# Altium footprint library Package_DFN_QFN.PcbLib: 557 footprints (part 22 of 35)
Each footprint in its own frame and in the unit in brackets; x right, y up, seen from the top. Pads: shape width x height; smd on the part's side, far side on the other; paste and mask are expansions set on the pad; w line width, h text height; cw(c..) or ccw(c..) is an arc to the next point about the centre after c.
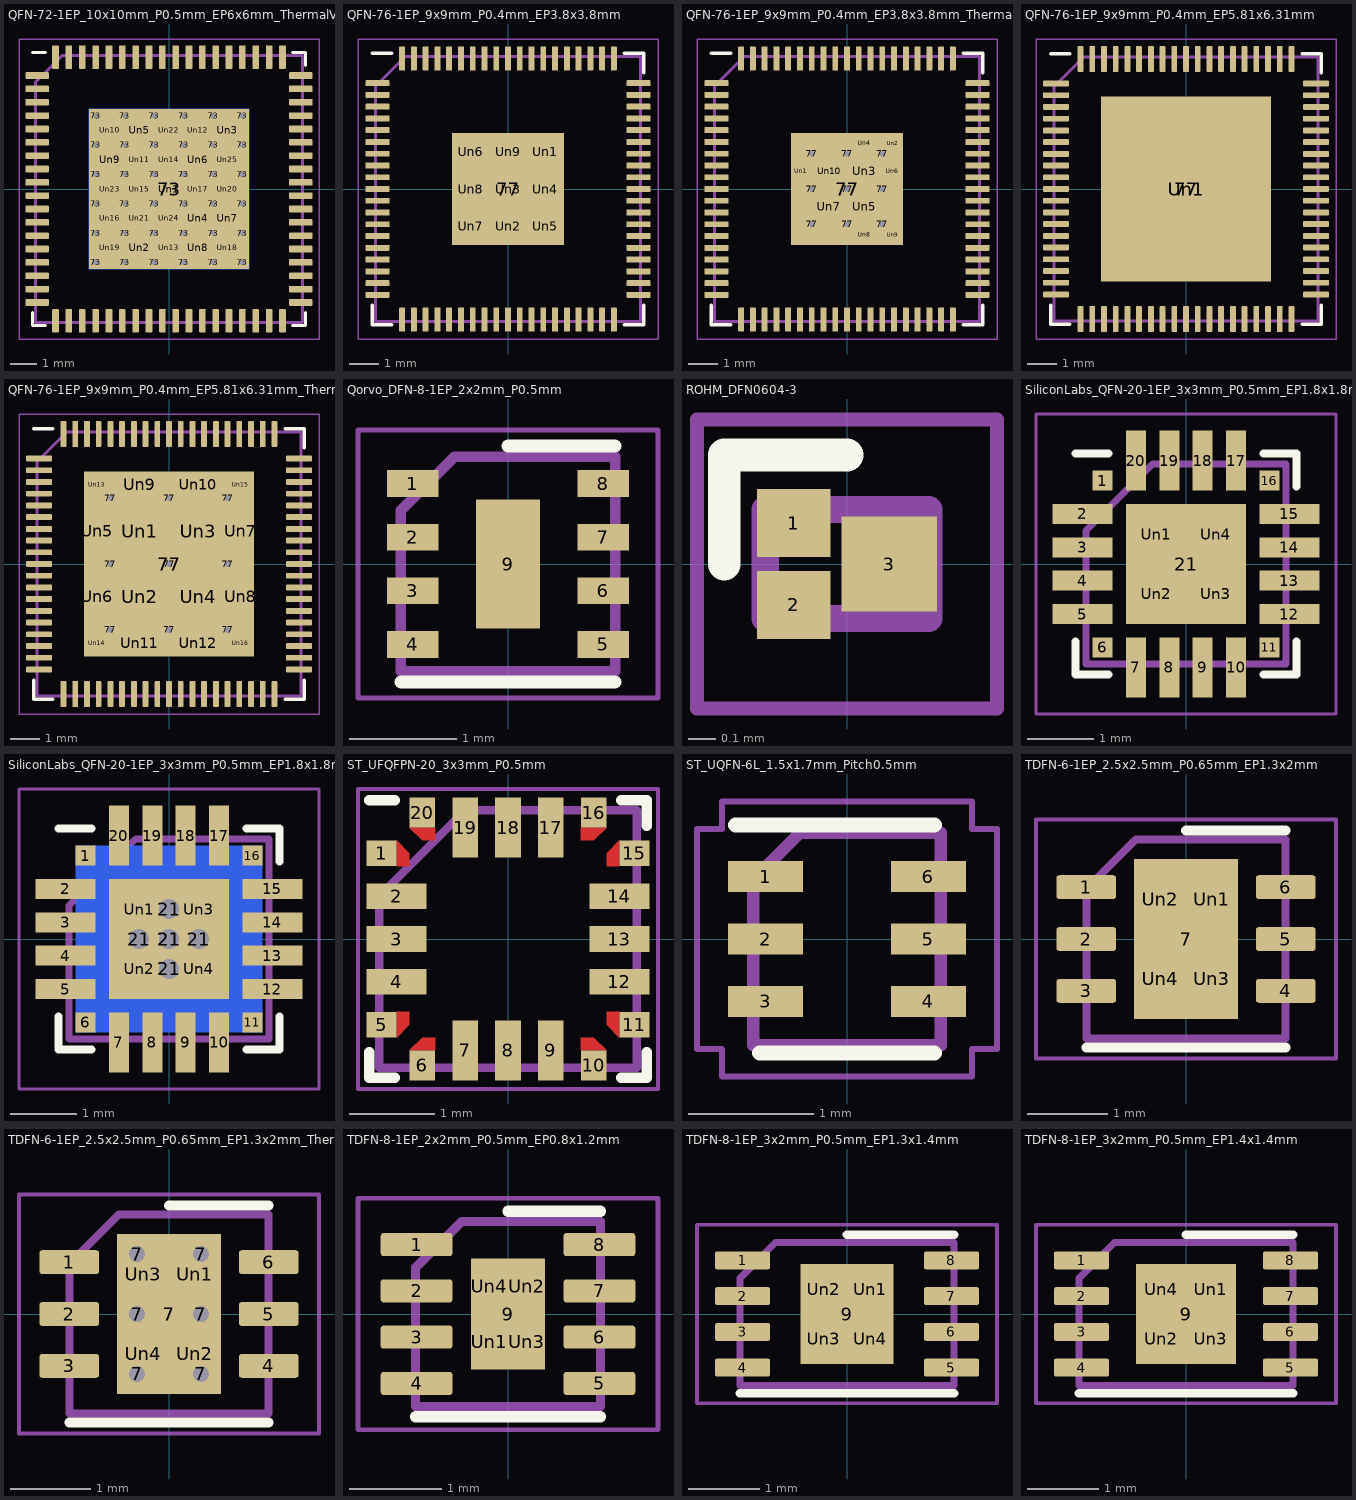
[diagram p21: the footprints below, top view; thin cyan lines are the x and y axes]

## QFN-72-1EP_10x10mm_P0.5mm_EP6x6mm_ThermalVias [mm]
pads (135):
  rrect25% 0.875x0.25 smd: 1(-4.938,4.25) 2(-4.938,3.75) 3(-4.938,3.25) 4(-4.938,2.75) 5(-4.938,2.25) 6(-4.938,1.75) 7(-4.938,1.25) 8(-4.938,0.75) 9(-4.938,0.25) 10(-4.938,-0.25) 11(-4.938,-0.75) 12(-4.938,-1.25) 13(-4.938,-1.75) 14(-4.938,-2.25) 15(-4.938,-2.75) 16(-4.938,-3.25) 17(-4.938,-3.75) 18(-4.938,-4.25) 37(4.938,-4.25) 38(4.938,-3.75) 39(4.938,-3.25) 40(4.938,-2.75) 41(4.938,-2.25) 42(4.938,-1.75) 43(4.938,-1.25) 44(4.938,-0.75) 45(4.938,-0.25) 46(4.938,0.25) 47(4.938,0.75) 48(4.938,1.25) 49(4.938,1.75) 50(4.938,2.25) 51(4.938,2.75) 52(4.938,3.25) 53(4.938,3.75) 54(4.938,4.25)
  rrect25% 0.25x0.875 smd: 19(-4.25,-4.938) 20(-3.75,-4.938) 21(-3.25,-4.938) 22(-2.75,-4.938) 23(-2.25,-4.938) 24(-1.75,-4.938) 25(-1.25,-4.938) 26(-0.75,-4.938) 27(-0.25,-4.938) 28(0.25,-4.938) 29(0.75,-4.938) 30(1.25,-4.938) 31(1.75,-4.938) 32(2.25,-4.938) 33(2.75,-4.938) 34(3.25,-4.938) 35(3.75,-4.938) 36(4.25,-4.938) 55(4.25,4.938) 56(3.75,4.938) 57(3.25,4.938) 58(2.75,4.938) 59(2.25,4.938) 60(1.75,4.938) 61(1.25,4.938) 62(0.75,4.938) 63(0.25,4.938) 64(-0.25,4.938) 65(-0.75,4.938) 66(-1.25,4.938) 67(-1.75,4.938) 68(-2.25,4.938) 69(-2.75,4.938) 70(-3.25,4.938) 71(-3.75,4.938) 72(-4.25,4.938)
  round 0.5 hole 0.2: 73(-2.75,-2.75) 73(-2.75,-1.65) 73(-2.75,-0.55) 73(-2.75,0.55) 73(-2.75,1.65) 73(-2.75,2.75) 73(-1.65,-2.75) 73(-1.65,-1.65) 73(-1.65,-0.55) 73(-1.65,0.55) 73(-1.65,1.65) 73(-1.65,2.75) 73(-0.55,-2.75) 73(-0.55,-1.65) 73(-0.55,-0.55) 73(-0.55,0.55) 73(-0.55,1.65) 73(-0.55,2.75) 73(0.55,-2.75) 73(0.55,-1.65) 73(0.55,-0.55) 73(0.55,0.55) 73(0.55,1.65) 73(0.55,2.75) 73(1.65,-2.75) 73(1.65,-1.65) 73(1.65,-0.55) 73(1.65,0.55) 73(1.65,1.65) 73(1.65,2.75) 73(2.75,-2.75) 73(2.75,-1.65) 73(2.75,-0.55) 73(2.75,0.55) 73(2.75,1.65) 73(2.75,2.75)
  rect 6x6 smd far side: 73(0,0)
  rect 6x6 smd: 73(0,0)
  rrect25% 0.93x0.93 on Top Paste: Un1(0,0) Un2(-1.1,-2.2) Un3(2.2,2.2) Un4(1.1,-1.1) Un5(-1.1,2.2) Un6(1.1,1.1) Un7(2.2,-1.1) Un8(1.1,-2.2) Un9(-2.2,1.1) Un10(-2.2,2.2) Un11(-1.1,1.1) Un12(1.1,2.2) Un13(0,-2.2) Un14(0,1.1) Un15(-1.1,0) Un16(-2.2,-1.1) Un17(1.1,0) Un18(2.2,-2.2) Un19(-2.2,-2.2) Un20(2.2,0) Un21(-1.1,-1.1) Un22(0,2.2) Un23(-2.2,0) Un24(0,-1.1) Un25(2.2,1.1)
F.SilkS:
  lines w0.12: -5.11,-4.635 -5.11,-5.11 -4.635,-5.11 ; -5.11,5.11 -4.635,5.11 ; 4.635,-5.11 5.11,-5.11 5.11,-4.635 ; 4.635,5.11 5.11,5.11 5.11,4.635
F.CrtYd:
  lines w0.05: -5.62,-5.62 -5.62,5.62 5.62,5.62 5.62,-5.62 -5.62,-5.62
F.Fab:
  lines w0.1: -5,-5 5,-5 5,5 -4,5 -5,4 -5,-5
  text "'.Designator'" at -4.047,-0.84 h1

## QFN-76-1EP_9x9mm_P0.4mm_EP3.8x3.8mm [mm]
pads (86):
  rrect25% 0.825x0.2 smd: 1(-4.437,3.6) 2(-4.437,3.2) 3(-4.437,2.8) 4(-4.437,2.4) 5(-4.437,2) 6(-4.437,1.6) 7(-4.437,1.2) 8(-4.437,0.8) 9(-4.437,0.4) 10(-4.437,0) 11(-4.437,-0.4) 12(-4.437,-0.8) 13(-4.437,-1.2) 14(-4.437,-1.6) 15(-4.437,-2) 16(-4.437,-2.4) 17(-4.437,-2.8) 18(-4.437,-3.2) 19(-4.437,-3.6) 39(4.437,-3.6) 40(4.437,-3.2) 41(4.437,-2.8) 42(4.437,-2.4) 43(4.437,-2) 44(4.437,-1.6) 45(4.437,-1.2) 46(4.437,-0.8) 47(4.437,-0.4) 48(4.437,0) 49(4.437,0.4) 50(4.437,0.8) 51(4.437,1.2) 52(4.437,1.6) 53(4.437,2) 54(4.437,2.4) 55(4.437,2.8) 56(4.437,3.2) 57(4.437,3.6)
  rrect25% 0.2x0.825 smd: 20(-3.6,-4.437) 21(-3.2,-4.437) 22(-2.8,-4.437) 23(-2.4,-4.437) 24(-2,-4.437) 25(-1.6,-4.437) 26(-1.2,-4.437) 27(-0.8,-4.437) 28(-0.4,-4.437) 29(0,-4.437) 30(0.4,-4.437) 31(0.8,-4.437) 32(1.2,-4.437) 33(1.6,-4.437) 34(2,-4.437) 35(2.4,-4.437) 36(2.8,-4.437) 37(3.2,-4.437) 38(3.6,-4.437) 58(3.6,4.437) 59(3.2,4.437) 60(2.8,4.437) 61(2.4,4.437) 62(2,4.437) 63(1.6,4.437) 64(1.2,4.437) 65(0.8,4.437) 66(0.4,4.437) 67(0,4.437) 68(-0.4,4.437) 69(-0.8,4.437) 70(-1.2,4.437) 71(-1.6,4.437) 72(-2,4.437) 73(-2.4,4.437) 74(-2.8,4.437) 75(-3.2,4.437) 76(-3.6,4.437)
  rect 3.8x3.8 smd: 77(0,0)
  rrect25% 1.02x1.02 on Top Paste: Un1(1.27,1.27) Un2(0,-1.27) Un3(0,0) Un4(1.27,0) Un5(1.27,-1.27) Un6(-1.27,1.27) Un7(-1.27,-1.27) Un8(-1.27,0) Un9(0,1.27)
F.SilkS:
  lines w0.12: -4.61,-3.96 -4.61,-4.61 -3.96,-4.61 ; -4.61,4.61 -3.96,4.61 ; 3.96,-4.61 4.61,-4.61 4.61,-3.96 ; 3.96,4.61 4.61,4.61 4.61,3.96
F.CrtYd:
  lines w0.05: -5.1,-5.1 5.1,-5.1 5.1,5.1 -5.1,5.1 -5.1,-5.1
F.Fab:
  lines w0.1: -4.5,-4.5 -4.5,3.5 -3.5,4.5 4.5,4.5 4.5,-4.5 -4.5,-4.5
  text "'.Designator'" at -4.047,-0.84 h1

## QFN-76-1EP_9x9mm_P0.4mm_EP3.8x3.8mm_ThermalVias [mm]
pads (103):
  rrect25% 0.825x0.2 smd: 1(-4.437,3.6) 2(-4.437,3.2) 3(-4.437,2.8) 4(-4.437,2.4) 5(-4.437,2) 6(-4.437,1.6) 7(-4.437,1.2) 8(-4.437,0.8) 9(-4.437,0.4) 10(-4.437,0) 11(-4.437,-0.4) 12(-4.437,-0.8) 13(-4.437,-1.2) 14(-4.437,-1.6) 15(-4.437,-2) 16(-4.437,-2.4) 17(-4.437,-2.8) 18(-4.437,-3.2) 19(-4.437,-3.6) 39(4.437,-3.6) 40(4.437,-3.2) 41(4.437,-2.8) 42(4.437,-2.4) 43(4.437,-2) 44(4.437,-1.6) 45(4.437,-1.2) 46(4.437,-0.8) 47(4.437,-0.4) 48(4.437,0) 49(4.437,0.4) 50(4.437,0.8) 51(4.437,1.2) 52(4.437,1.6) 53(4.437,2) 54(4.437,2.4) 55(4.437,2.8) 56(4.437,3.2) 57(4.437,3.6)
  rrect25% 0.2x0.825 smd: 20(-3.6,-4.437) 21(-3.2,-4.437) 22(-2.8,-4.437) 23(-2.4,-4.437) 24(-2,-4.437) 25(-1.6,-4.437) 26(-1.2,-4.437) 27(-0.8,-4.437) 28(-0.4,-4.437) 29(0,-4.437) 30(0.4,-4.437) 31(0.8,-4.437) 32(1.2,-4.437) 33(1.6,-4.437) 34(2,-4.437) 35(2.4,-4.437) 36(2.8,-4.437) 37(3.2,-4.437) 38(3.6,-4.437) 58(3.6,4.437) 59(3.2,4.437) 60(2.8,4.437) 61(2.4,4.437) 62(2,4.437) 63(1.6,4.437) 64(1.2,4.437) 65(0.8,4.437) 66(0.4,4.437) 67(0,4.437) 68(-0.4,4.437) 69(-0.8,4.437) 70(-1.2,4.437) 71(-1.6,4.437) 72(-2,4.437) 73(-2.4,4.437) 74(-2.8,4.437) 75(-3.2,4.437) 76(-3.6,4.437)
  round 0.5 hole 0.2: 77(-1.2,-1.2) 77(-1.2,0) 77(-1.2,1.2) 77(0,-1.2) 77(0,0) 77(0,1.2) 77(1.2,-1.2) 77(1.2,0) 77(1.2,1.2)
  rect 2.9x2.9 smd far side: 77(0,0)
  rect 3.8x3.8 smd: 77(0,0)
  round 0.495 on Top Paste: Un1(-1.55,0.6) Un4(0.6,1.55) Un6(1.55,0.6) Un8(0.6,-1.55) Un11(-0.6,1.55) Un12(-1.55,-0.6) Un15(-0.6,-1.55) Un16(1.55,-0.6)
  round 0.46 on Top Paste: Un2(1.55,1.55) Un9(1.55,-1.55) Un13(-1.55,-1.55) Un14(-1.55,1.55)
  rrect25% 0.967x0.967 on Top Paste: Un3(0.6,0.6) Un5(0.6,-0.6) Un7(-0.6,-0.6) Un10(-0.6,0.6)
F.SilkS:
  lines w0.12: -4.61,-3.96 -4.61,-4.61 -3.96,-4.61 ; -4.61,4.61 -3.96,4.61 ; 3.96,-4.61 4.61,-4.61 4.61,-3.96 ; 3.96,4.61 4.61,4.61 4.61,3.96
F.Paste:
  region: -1.338,0.956 -1.338,0.244 -1.396,0.186 -1.762,0.186 -1.762,1.014 -1.396,1.014
  region: 1.728,1.372 1.458,1.372 1.372,1.458 1.372,1.728 1.728,1.728
  region: 1.014,1.396 0.956,1.338 0.244,1.338 0.186,1.396 0.186,1.762 1.014,1.762
  region: 1.762,0.186 1.396,0.186 1.338,0.244 1.338,0.956 1.396,1.014 1.762,1.014
  region: 1.014,-1.396 1.014,-1.762 0.186,-1.762 0.186,-1.396 0.244,-1.338 0.956,-1.338
  region: 1.728,-1.728 1.372,-1.728 1.372,-1.458 1.458,-1.372 1.728,-1.372
  region: -0.186,1.396 -0.244,1.338 -0.956,1.338 -1.014,1.396 -1.014,1.762 -0.186,1.762
  region: -1.338,-0.244 -1.338,-0.956 -1.396,-1.014 -1.762,-1.014 -1.762,-0.186 -1.396,-0.186
  region: -1.372,-1.458 -1.372,-1.728 -1.728,-1.728 -1.728,-1.372 -1.458,-1.372
  region: -1.372,1.458 -1.458,1.372 -1.728,1.372 -1.728,1.728 -1.372,1.728
  region: -0.186,-1.396 -0.186,-1.762 -1.014,-1.762 -1.014,-1.396 -0.956,-1.338 -0.244,-1.338
  region: 1.762,-1.014 1.396,-1.014 1.338,-0.956 1.338,-0.244 1.396,-0.186 1.762,-0.186
F.CrtYd:
  lines w0.05: -5.1,-5.1 -5.1,5.1 5.1,5.1 5.1,-5.1 -5.1,-5.1
F.Fab:
  lines w0.1: -4.5,-4.5 -4.5,3.5 -3.5,4.5 4.5,4.5 4.5,-4.5 -4.5,-4.5
  text "'.Designator'" at -4.047,-0.84 h1

## QFN-76-1EP_9x9mm_P0.4mm_EP5.81x6.31mm [mm]
pads (78):
  rrect25% 0.875x0.2 smd: 1(-4.437,3.6) 2(-4.437,3.2) 3(-4.437,2.8) 4(-4.437,2.4) 5(-4.437,2) 6(-4.437,1.6) 7(-4.437,1.2) 8(-4.437,0.8) 9(-4.437,0.4) 10(-4.437,0) 11(-4.437,-0.4) 12(-4.437,-0.8) 13(-4.437,-1.2) 14(-4.437,-1.6) 15(-4.437,-2) 16(-4.437,-2.4) 17(-4.437,-2.8) 18(-4.437,-3.2) 19(-4.437,-3.6) 39(4.437,-3.6) 40(4.437,-3.2) 41(4.437,-2.8) 42(4.437,-2.4) 43(4.437,-2) 44(4.437,-1.6) 45(4.437,-1.2) 46(4.437,-0.8) 47(4.437,-0.4) 48(4.437,0) 49(4.437,0.4) 50(4.437,0.8) 51(4.437,1.2) 52(4.437,1.6) 53(4.437,2) 54(4.437,2.4) 55(4.437,2.8) 56(4.437,3.2) 57(4.437,3.6)
  rrect25% 0.2x0.875 smd: 20(-3.6,-4.437) 21(-3.2,-4.437) 22(-2.8,-4.437) 23(-2.4,-4.437) 24(-2,-4.437) 25(-1.6,-4.437) 26(-1.2,-4.437) 27(-0.8,-4.437) 28(-0.4,-4.437) 29(0,-4.437) 30(0.4,-4.437) 31(0.8,-4.437) 32(1.2,-4.437) 33(1.6,-4.437) 34(2,-4.437) 35(2.4,-4.437) 36(2.8,-4.437) 37(3.2,-4.437) 38(3.6,-4.437) 58(3.6,4.437) 59(3.2,4.437) 60(2.8,4.437) 61(2.4,4.437) 62(2,4.437) 63(1.6,4.437) 64(1.2,4.437) 65(0.8,4.437) 66(0.4,4.437) 67(0,4.437) 68(-0.4,4.437) 69(-0.8,4.437) 70(-1.2,4.437) 71(-1.6,4.437) 72(-2,4.437) 73(-2.4,4.437) 74(-2.8,4.437) 75(-3.2,4.437) 76(-3.6,4.437)
  rect 5.81x6.31 smd: 77(0,0)
  rrect5% 4.68x5.09 on Top Paste: Un1(0,0)
F.SilkS:
  lines w0.12: -4.61,-3.96 -4.61,-4.61 -3.96,-4.61 ; -4.61,4.61 -3.96,4.61 ; 3.96,-4.61 4.61,-4.61 4.61,-3.96 ; 3.96,4.61 4.61,4.61 4.61,3.96
F.CrtYd:
  lines w0.05: -5.12,-5.12 -5.12,5.12 5.12,5.12 5.12,-5.12 -5.12,-5.12
F.Fab:
  lines w0.1: -4.5,-4.5 4.5,-4.5 4.5,4.5 -3.5,4.5 -4.5,3.5 -4.5,-4.5
  text "'.Designator'" at -4.047,-0.84 h1

## QFN-76-1EP_9x9mm_P0.4mm_EP5.81x6.31mm_ThermalVias [mm]
pads (103):
  rrect25% 0.875x0.2 smd: 1(-4.437,3.6) 2(-4.437,3.2) 3(-4.437,2.8) 4(-4.437,2.4) 5(-4.437,2) 6(-4.437,1.6) 7(-4.437,1.2) 8(-4.437,0.8) 9(-4.437,0.4) 10(-4.437,0) 11(-4.437,-0.4) 12(-4.437,-0.8) 13(-4.437,-1.2) 14(-4.437,-1.6) 15(-4.437,-2) 16(-4.437,-2.4) 17(-4.437,-2.8) 18(-4.437,-3.2) 19(-4.437,-3.6) 39(4.437,-3.6) 40(4.437,-3.2) 41(4.437,-2.8) 42(4.437,-2.4) 43(4.437,-2) 44(4.437,-1.6) 45(4.437,-1.2) 46(4.437,-0.8) 47(4.437,-0.4) 48(4.437,0) 49(4.437,0.4) 50(4.437,0.8) 51(4.437,1.2) 52(4.437,1.6) 53(4.437,2) 54(4.437,2.4) 55(4.437,2.8) 56(4.437,3.2) 57(4.437,3.6)
  rrect25% 0.2x0.875 smd: 20(-3.6,-4.437) 21(-3.2,-4.437) 22(-2.8,-4.437) 23(-2.4,-4.437) 24(-2,-4.437) 25(-1.6,-4.437) 26(-1.2,-4.437) 27(-0.8,-4.437) 28(-0.4,-4.437) 29(0,-4.437) 30(0.4,-4.437) 31(0.8,-4.437) 32(1.2,-4.437) 33(1.6,-4.437) 34(2,-4.437) 35(2.4,-4.437) 36(2.8,-4.437) 37(3.2,-4.437) 38(3.6,-4.437) 58(3.6,4.437) 59(3.2,4.437) 60(2.8,4.437) 61(2.4,4.437) 62(2,4.437) 63(1.6,4.437) 64(1.2,4.437) 65(0.8,4.437) 66(0.4,4.437) 67(0,4.437) 68(-0.4,4.437) 69(-0.8,4.437) 70(-1.2,4.437) 71(-1.6,4.437) 72(-2,4.437) 73(-2.4,4.437) 74(-2.8,4.437) 75(-3.2,4.437) 76(-3.6,4.437)
  round 0.5 hole 0.2: 77(-2,-2.25) 77(-2,0) 77(-2,2.25) 77(0,-2.25) 77(0,0) 77(0,2.25) 77(2,-2.25) 77(2,0) 77(2,2.25)
  rect 5.81x6.31 smd: 77(0,0)
  rect 4.5x5 smd far side: 77(0,0)
  rrect16% 1.612x1.814 on Top Paste: Un1(-1,1.125) Un2(-1,-1.125) Un3(1,1.125) Un4(1,-1.125)
  rrect25% 0.73x1.814 on Top Paste: Un5(-2.452,1.125) Un6(-2.452,-1.125) Un7(2.452,1.125) Un8(2.452,-1.125)
  rrect25% 1.612x0.73 on Top Paste: Un9(-1,2.702) Un10(1,2.702) Un11(-1,-2.702) Un12(1,-2.702)
  round 0.654 on Top Paste: Un13(-2.452,2.702) Un14(-2.452,-2.702) Un15(2.452,2.702) Un16(2.452,-2.702)
F.SilkS:
  lines w0.12: -4.61,-3.96 -4.61,-4.61 -3.96,-4.61 ; -4.61,4.61 -3.96,4.61 ; 3.96,-4.61 4.61,-4.61 4.61,-3.96 ; 3.96,4.61 4.61,4.61 4.61,3.96
F.Paste:
  region: -2.164,2.477 -2.227,2.414 -2.741,2.414 -2.741,2.991 -2.164,2.991
  region: -2.164,-2.477 -2.164,-2.991 -2.741,-2.991 -2.741,-2.414 -2.227,-2.414
  region: 2.741,2.414 2.227,2.414 2.164,2.477 2.164,2.991 2.741,2.991
  region: 2.741,-2.991 2.164,-2.991 2.164,-2.477 2.227,-2.414 2.741,-2.414
F.CrtYd:
  lines w0.05: -5.12,-5.12 -5.12,5.12 5.12,5.12 5.12,-5.12 -5.12,-5.12
F.Fab:
  lines w0.1: -4.5,-4.5 4.5,-4.5 4.5,4.5 -3.5,4.5 -4.5,3.5 -4.5,-4.5
  text "'.Designator'" at -4.047,-0.84 h1

## Qorvo_DFN-8-1EP_2x2mm_P0.5mm [mm]
pads (9):
  rect 0.48x0.25 smd: 1(-0.89,0.75) 2(-0.89,0.25) 3(-0.89,-0.25) 4(-0.89,-0.75) 5(0.89,-0.75) 6(0.89,-0.25) 7(0.89,0.25) 8(0.89,0.75)
  rect 0.6x1.2 smd: 9(0,0)
F.SilkS:
  lines w0.12: -1,-1.1 1,-1.1 ; 0,1.1 1,1.1
F.CrtYd:
  lines w0.05: -1.4,-1.25 -1.4,1.25 1.4,1.25 1.4,-1.25 -1.4,-1.25
F.Fab:
  lines w0.1: -1,-1 1,-1 1,1 -0.5,1 -1,0.5 -1,-1
  text "'.Designator'" at -1.619,-0.336 h0.4

## ROHM_DFN0604-3 [mm]
pads (3):
  rect 0.27x0.25 smd: 1(-0.195,0.15) 2(-0.195,-0.15)
  rect 0.35x0.35 smd: 3(0.155,0)
F.SilkS:
  lines w0.12: -0.45,0 -0.45,0.4 -0.4,0.4 0,0.4
F.CrtYd:
  lines w0.05: -0.55,-0.53 0.55,-0.53 0.55,0.53 -0.55,0.53 -0.55,-0.53
F.Fab:
  lines w0.1: -0.3,-0.2 -0.3,0.2 0.3,0.2 0.3,-0.2 -0.3,-0.2
  text "'.Designator'" at -4.047,0.76 h1

## SiliconLabs_QFN-20-1EP_3x3mm_P0.5mm_EP1.8x1.8mm [mm]
pads (25):
  rect 0.3x0.3 smd: 1(-1.25,1.25) 6(-1.25,-1.25) 11(1.25,-1.25) 16(1.25,1.25)
  rect 0.9x0.3 smd: 2(-1.55,0.75) 3(-1.55,0.25) 4(-1.55,-0.25) 5(-1.55,-0.75) 12(1.55,-0.75) 13(1.55,-0.25) 14(1.55,0.25) 15(1.55,0.75)
  rect 0.3x0.9 smd: 7(-0.75,-1.55) 8(-0.25,-1.55) 9(0.25,-1.55) 10(0.75,-1.55) 17(0.75,1.55) 18(0.25,1.55) 19(-0.25,1.55) 20(-0.75,1.55)
  rect 1.8x1.8 smd: 21(0,0)
  rect 0.54x0.54 on Top Paste: Un1(-0.45,0.45) Un2(-0.45,-0.45) Un3(0.45,-0.45) Un4(0.45,0.45)
F.SilkS:
  lines w0.12: -1.66,-1.16 -1.66,-1.66 -1.16,-1.66 ; -1.66,1.66 -1.16,1.66 ; 1.16,-1.66 1.66,-1.66 1.66,-1.16 ; 1.16,1.66 1.66,1.66 1.66,1.16
F.CrtYd:
  lines w0.05: -2.25,-2.25 2.25,-2.25 2.25,2.25 -2.25,2.25 -2.25,-2.25
F.Fab:
  lines w0.1: -1.5,-1.5 -1.5,0.5 -0.5,1.5 1.5,1.5 1.5,-1.5 -1.5,-1.5
  text "'.Designator'" at -2.658,-0.574 h0.65

## SiliconLabs_QFN-20-1EP_3x3mm_P0.5mm_EP1.8x1.8mm_ThermalVias [mm]
pads (31):
  rect 0.3x0.3 smd: 1(-1.25,1.25) 6(-1.25,-1.25) 11(1.25,-1.25) 16(1.25,1.25)
  rect 0.9x0.3 smd: 2(-1.55,0.75) 3(-1.55,0.25) 4(-1.55,-0.25) 5(-1.55,-0.75) 12(1.55,-0.75) 13(1.55,-0.25) 14(1.55,0.25) 15(1.55,0.75)
  rect 0.3x0.9 smd: 7(-0.75,-1.55) 8(-0.25,-1.55) 9(0.25,-1.55) 10(0.75,-1.55) 17(0.75,1.55) 18(0.25,1.55) 19(-0.25,1.55) 20(-0.75,1.55)
  round 0.6 hole 0.3: 21(-0.45,0) 21(0,-0.45) 21(0,0) 21(0,0.45) 21(0.45,0)
  rect 1.8x1.8 smd: 21(0,0)
  rect 2.8x2.8 smd far side: 21(0,0)
  rect 0.54x0.54 on Top Paste: Un1(-0.45,0.45) Un2(-0.45,-0.45) Un3(0.45,0.45) Un4(0.45,-0.45)
F.SilkS:
  lines w0.12: -1.66,-1.16 -1.66,-1.66 -1.16,-1.66 ; -1.66,1.66 -1.16,1.66 ; 1.16,-1.66 1.66,-1.66 1.66,-1.16 ; 1.16,1.66 1.66,1.66 1.66,1.16
F.CrtYd:
  lines w0.05: -2.25,-2.25 2.25,-2.25 2.25,2.25 -2.25,2.25 -2.25,-2.25
F.Fab:
  lines w0.1: -1.5,-1.5 -1.5,0.5 -0.5,1.5 1.5,1.5 1.5,-1.5 -1.5,-1.5
  text "'.Designator'" at -2.658,-0.574 h0.65

## ST_UFQFPN-20_3x3mm_P0.5mm [mm]
pads (20):
  rect 0.35x0.3 smd: 1(-1.475,1) 5(-1.475,-1) 11(1.475,-1) 15(1.475,1)
  rect 0.7x0.3 smd: 2(-1.3,0.5) 3(-1.3,0) 4(-1.3,-0.5) 12(1.3,-0.5) 13(1.3,0) 14(1.3,0.5)
  rect 0.3x0.35 smd: 6(-1,-1.475) 10(1,-1.475) 16(1,1.475) 20(-1,1.475)
  rect 0.3x0.7 smd: 7(-0.5,-1.3) 8(0,-1.3) 9(0.5,-1.3) 17(0.5,1.3) 18(0,1.3) 19(-0.5,1.3)
F.Cu:
  region: -1.15,1 -1.15,0.85 -1.3,0.85 -1.3,1.15
  region: -1.15,-1 -1.3,-1.15 -1.3,-0.85 -1.15,-0.85
  region: -0.85,-1.3 -1.15,-1.3 -1,-1.15 -0.85,-1.15
  region: 1.15,-1.3 0.85,-1.3 0.85,-1.15 1,-1.15
  region: 1.3,-1.15 1.15,-1 1.15,-0.85 1.3,-0.85
  region: 1.3,0.85 1.15,0.85 1.15,1 1.3,1.15
  region: 1,1.15 0.85,1.15 0.85,1.3 1.15,1.3
  region: -0.85,1.15 -1,1.15 -1.15,1.3 -0.85,1.3
F.SilkS:
  lines w0.12: -1.62,-1.32 -1.62,-1.62 -1.32,-1.62 ; -1.62,1.62 -1.32,1.62 ; 1.32,-1.62 1.62,-1.62 1.62,-1.32 ; 1.32,1.62 1.62,1.62 1.62,1.32
F.Paste:
  region: -1.15,1 -1.15,0.85 -1.3,0.85 -1.3,1.15
  region: -1.15,-1 -1.3,-1.15 -1.3,-0.85 -1.15,-0.85
  region: -0.85,-1.3 -1.15,-1.3 -1,-1.15 -0.85,-1.15
  region: 1.15,-1.3 0.85,-1.3 0.85,-1.15 1,-1.15
  region: 1.3,-1.15 1.15,-1 1.15,-0.85 1.3,-0.85
  region: 1.3,0.85 1.15,0.85 1.15,1 1.3,1.15
  region: 1,1.15 0.85,1.15 0.85,1.3 1.15,1.3
  region: -0.85,1.15 -1,1.15 -1.15,1.3 -0.85,1.3
F.Mask:
  region: -1.15,1 -1.15,0.85 -1.3,0.85 -1.3,1.15
  region: -1.15,-1 -1.3,-1.15 -1.3,-0.85 -1.15,-0.85
  region: -0.85,-1.3 -1.15,-1.3 -1,-1.15 -0.85,-1.15
  region: 1.15,-1.3 0.85,-1.3 0.85,-1.15 1,-1.15
  region: 1.3,-1.15 1.15,-1 1.15,-0.85 1.3,-0.85
  region: 1.3,0.85 1.15,0.85 1.15,1 1.3,1.15
  region: 1,1.15 0.85,1.15 0.85,1.3 1.15,1.3
  region: -0.85,1.15 -1,1.15 -1.15,1.3 -0.85,1.3
F.CrtYd:
  lines w0.05: -1.75,-1.75 1.75,-1.75 1.75,1.75 -1.75,1.75 -1.75,-1.75
F.Fab:
  lines w0.1: -1.5,-1.5 1.5,-1.5 1.5,1.5 -0.5,1.5 -1.5,0.5 -1.5,-1.5
  text "'.Designator'" at -2.828,-0.583 h0.7

## ST_UQFN-6L_1.5x1.7mm_Pitch0.5mm [mm]
pads (6):
  rect 0.6x0.25 smd: 1(-0.65,0.5) 2(-0.65,0) 3(-0.65,-0.5) 4(0.65,-0.5) 5(0.65,0) 6(0.65,0.5)
F.SilkS:
  lines w0.12: -0.89,0.91 0.7,0.91 ; -0.7,-0.91 0.7,-0.91
F.CrtYd:
  lines w0.05: -1.2,-0.88 -1.2,0.88 -1,0.88 -1,1.1 1,1.1 1,0.88 1.2,0.88 1.2,-0.88 1,-0.88 1,-1.1 -1,-1.1 -1,-0.88 -1.2,-0.88
F.Fab:
  lines w0.1: -0.75,-0.85 0.75,-0.85 0.75,0.85 -0.375,0.85 -0.75,0.475 -0.75,-0.85
  text "'.Designator'" at 0.319,-1.538 h0.38

## TDFN-6-1EP_2.5x2.5mm_P0.65mm_EP1.3x2mm [mm]
pads (11):
  rrect25% 0.75x0.3 smd: 1(-1.25,0.65) 2(-1.25,0) 3(-1.25,-0.65) 4(1.25,-0.65) 5(1.25,0) 6(1.25,0.65)
  rect 1.3x2 smd: 7(0,0)
  rrect25% 0.52x0.81 on Top Paste: Un1(0.325,0.5) Un2(-0.325,0.5) Un3(0.325,-0.5) Un4(-0.325,-0.5)
F.SilkS:
  lines w0.12: -1.25,-1.36 1.25,-1.36 ; 0,1.36 1.25,1.36
F.CrtYd:
  lines w0.05: -1.88,-1.5 1.88,-1.5 1.88,1.5 -1.88,1.5 -1.88,-1.5
F.Fab:
  lines w0.1: -1.25,-1.25 1.25,-1.25 1.25,1.25 -0.625,1.25 -1.25,0.625 -1.25,-1.25
  text "'.Designator'" at -2.506,-0.518 h0.62

## TDFN-6-1EP_2.5x2.5mm_P0.65mm_EP1.3x2mm_ThermalVias [mm]
pads (18):
  rrect25% 0.75x0.3 smd: 1(-1.25,0.65) 2(-1.25,0) 3(-1.25,-0.65) 4(1.25,-0.65) 5(1.25,0) 6(1.25,0.65)
  round 0.5 hole 0.2: 7(-0.4,-0.75) 7(-0.4,0) 7(-0.4,0.75) 7(0.4,-0.75) 7(0.4,0) 7(0.4,0.75)
  rect 1.3x2 smd far side: 7(0,0)
  rect 1.3x2 smd: 7(0,0)
  rrect25% 0.56x0.87 on Top Paste: Un1(0.325,0.5) Un2(0.325,-0.5) Un3(-0.325,0.5) Un4(-0.325,-0.5)
F.SilkS:
  lines w0.12: -1.25,-1.36 1.25,-1.36 ; 0,1.36 1.25,1.36
F.CrtYd:
  lines w0.05: -1.88,-1.5 -1.88,1.5 1.88,1.5 1.88,-1.5 -1.88,-1.5
F.Fab:
  lines w0.1: -1.25,-1.25 -1.25,0.625 -0.625,1.25 1.25,1.25 1.25,-1.25 -1.25,-1.25
  text "'.Designator'" at -2.506,-0.518 h0.62

## TDFN-8-1EP_2x2mm_P0.5mm_EP0.8x1.2mm [mm]
pads (13):
  rrect25% 0.775x0.25 smd: 1(-0.988,0.75) 2(-0.988,0.25) 3(-0.988,-0.25) 4(-0.988,-0.75) 5(0.988,-0.75) 6(0.988,-0.25) 7(0.988,0.25) 8(0.988,0.75)
  rect 0.8x1.2 smd: 9(0,0)
  rrect25% 0.32x0.48 on Top Paste: Un1(-0.2,-0.3) Un2(0.2,0.3) Un3(0.2,-0.3) Un4(-0.2,0.3)
F.SilkS:
  lines w0.12: -1,-1.11 1,-1.11 ; 0,1.11 1,1.11
F.CrtYd:
  lines w0.05: -1.62,-1.25 -1.62,1.25 1.62,1.25 1.62,-1.25 -1.62,-1.25
F.Fab:
  lines w0.1: -1,-1 1,-1 1,1 -0.5,1 -1,0.5 -1,-1
  text "'.Designator'" at -2.028,-0.425 h0.5

## TDFN-8-1EP_3x2mm_P0.5mm_EP1.3x1.4mm [mm]
pads (13):
  rrect25% 0.775x0.25 smd: 1(-1.462,0.75) 2(-1.462,0.25) 3(-1.462,-0.25) 4(-1.462,-0.75) 5(1.462,-0.75) 6(1.462,-0.25) 7(1.462,0.25) 8(1.462,0.75)
  rect 1.3x1.4 smd: 9(0,0)
  rrect25% 0.52x0.56 on Top Paste: Un1(0.325,0.35) Un2(-0.325,0.35) Un3(-0.325,-0.35) Un4(0.325,-0.35)
F.SilkS:
  lines w0.12: -1.5,-1.11 1.5,-1.11 ; 0,1.11 1.5,1.11
F.CrtYd:
  lines w0.05: -2.1,-1.25 -2.1,1.25 2.1,1.25 2.1,-1.25 -2.1,-1.25
F.Fab:
  lines w0.1: -1.5,-1 -1.5,0.5 -1,1 1.5,1 1.5,-1 -1.5,-1
  text "'.Designator'" at -3.033,-0.628 h0.75

## TDFN-8-1EP_3x2mm_P0.5mm_EP1.4x1.4mm [mm]
pads (13):
  rrect25% 0.775x0.25 smd: 1(-1.462,0.75) 2(-1.462,0.25) 3(-1.462,-0.25) 4(-1.462,-0.75) 5(1.462,-0.75) 6(1.462,-0.25) 7(1.462,0.25) 8(1.462,0.75)
  rect 1.4x1.4 smd: 9(0,0)
  rrect25% 0.56x0.56 on Top Paste: Un1(0.35,0.35) Un2(-0.35,-0.35) Un3(0.35,-0.35) Un4(-0.35,0.35)
F.SilkS:
  lines w0.12: -1.5,-1.11 1.5,-1.11 ; 0,1.11 1.5,1.11
F.CrtYd:
  lines w0.05: -2.1,-1.25 -2.1,1.25 2.1,1.25 2.1,-1.25 -2.1,-1.25
F.Fab:
  lines w0.1: -1.5,-1 -1.5,0.5 -1,1 1.5,1 1.5,-1 -1.5,-1
  text "'.Designator'" at -3.033,-0.628 h0.75